# Altium footprint library 4.49-接插件.PcbLib: 260 footprints (part 5 of 17)
Each footprint in its own frame and in the unit in brackets; x right, y up, seen from the top. Pads: shape width x height; smd on the part's side, far side on the other; paste and mask are expansions set on the pad; w line width, h text height; cw(c..) or ccw(c..) is an arc to the next point about the centre after c.
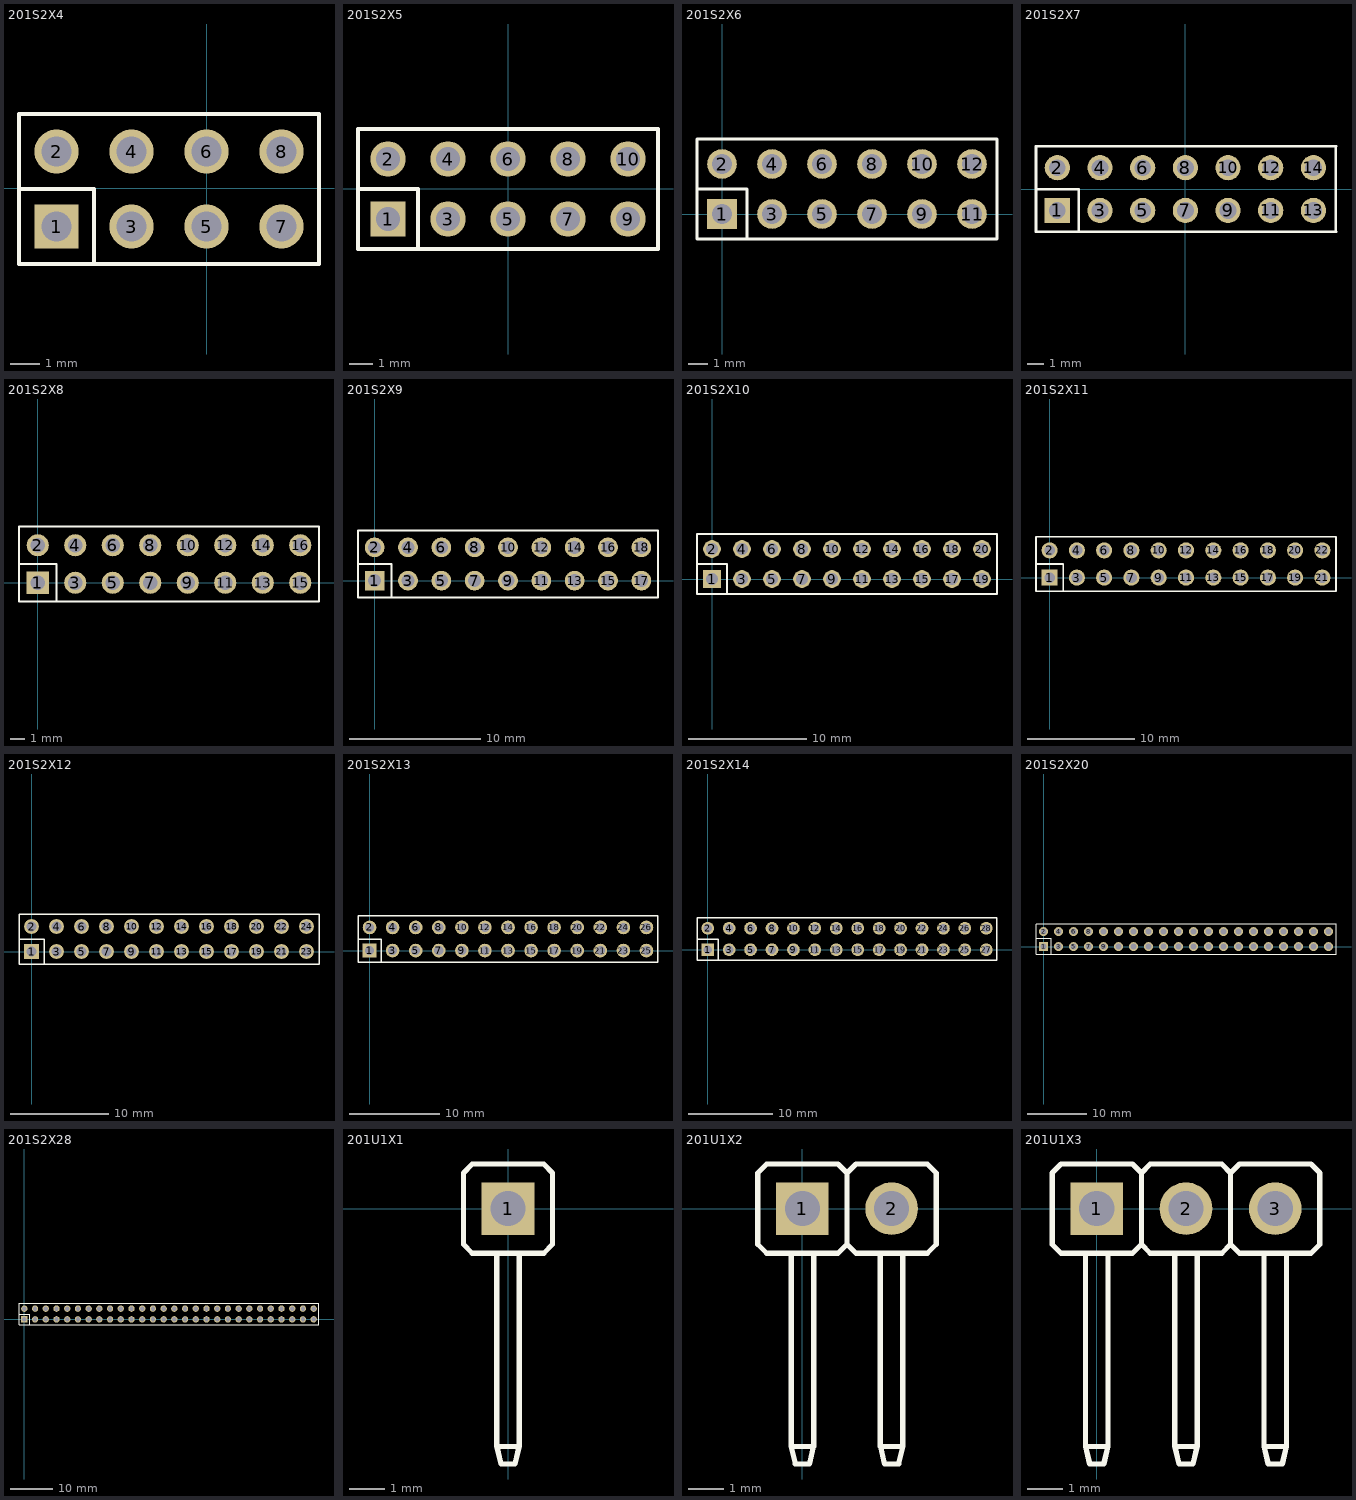
[diagram p4: the footprints below, top view; thin cyan lines are the x and y axes]

## 201S2X4 [mm]
pads (8):
  rect 1.5x1.5 hole 1: 1(-5.084,-1.29)
  round 1.5 hole 1: 2(-5.084,1.25) 3(-2.544,-1.29) 4(-2.544,1.25) 5(-0.004,-1.29) 6(-0.004,1.25) 7(2.536,-1.29) 8(2.536,1.25)
Top Overlay:
  lines w0.15: -6.354,-0.02 -3.814,-0.02 -3.814,-2.56 ; -6.354,-2.56 3.806,-2.56 3.806,2.52 -6.354,2.52 -6.354,-2.56
3D body: height 8.4, standoff -3, extent -6.354,-2.52 3.806,2.48

## 201S2X5 [mm]
pads (10):
  rect 1.5x1.5 hole 1: 1(-5.084,-1.29)
  round 1.5 hole 1: 2(-5.084,1.25) 3(-2.544,-1.29) 4(-2.544,1.25) 5(-0.004,-1.29) 6(-0.004,1.25) 7(2.536,-1.29) 8(2.536,1.25) 9(5.076,-1.29) 10(5.076,1.25)
Top Overlay:
  lines w0.15: -6.354,-0.02 -3.814,-0.02 -3.814,-2.56 ; -6.354,-2.56 -6.354,2.52 6.346,2.52 6.346,-2.56 -6.354,-2.56
3D body: height 8.4, standoff -3, extent -6.354,-2.52 6.346,2.48

## 201S2X6 [mm]
pads (12):
  rect 1.5x1.5 hole 1: 1(0,0)
  round 1.5 hole 1: 2(0,2.54) 3(2.54,0) 4(2.54,2.54) 5(5.08,0) 6(5.08,2.54) 7(7.62,0) 8(7.62,2.54) 9(10.16,0) 10(10.16,2.54) 11(12.7,0) 12(12.7,2.54)
Top Overlay:
  lines w0.15: -1.27,1.27 1.27,1.27 1.27,-1.27 ; -1.27,-1.27 13.97,-1.27 13.97,3.81 -1.27,3.81 -1.27,-1.27
3D body: height 8.4, standoff -3, extent -1.27,-1.23 13.97,3.77

## 201S2X7 [mm]
pads (14):
  rect 1.5x1.5 hole 1: 1(-7.601,-1.25)
  round 1.5 hole 1: 2(-7.601,1.29) 3(-5.061,-1.25) 4(-5.061,1.29) 5(-2.521,-1.25) 6(-2.521,1.29) 7(0.019,-1.25) 8(0.019,1.29) 9(2.559,-1.25) 10(2.559,1.29) 11(5.099,-1.25) 12(5.099,1.29) 13(7.639,-1.25) 14(7.639,1.29)
Top Overlay:
  lines w0.15: -8.871,0.02 -6.331,0.02 -6.331,-2.52 ; 8.979,-2.52 8.979,2.56 ; 8.983,-2.515 -8.871,-2.52 -8.871,2.56 8.983,2.57
3D body: height 8.4, standoff -3, extent -8.834,-2.48 8.946,2.52

## 201S2X8 [mm]
pads (16):
  rect 1.5x1.5 hole 1: 1(0,0)
  round 1.5 hole 1: 2(0,2.54) 3(2.54,0) 4(2.54,2.54) 5(5.08,0) 6(5.08,2.54) 7(7.62,0) 8(7.62,2.54) 9(10.16,0) 10(10.16,2.54) 11(12.7,0) 12(12.7,2.54) 13(15.24,0) 14(15.24,2.54) 15(17.78,0) 16(17.78,2.54)
Top Overlay:
  lines w0.15: -1.27,1.27 1.27,1.27 1.27,-1.27 ; -1.27,-1.27 -1.27,3.81 19.05,3.81 19.05,-1.27 -1.27,-1.27
3D body: height 8.4, standoff -3, extent -1.27,-1.23 19.05,3.77

## 201S2X9 [mm]
pads (18):
  rect 1.5x1.5 hole 1: 1(0,0)
  round 1.5 hole 1: 2(0,2.54) 3(2.54,0) 4(2.54,2.54) 5(5.08,0) 6(5.08,2.54) 7(7.62,0) 8(7.62,2.54) 9(10.16,0) 10(10.16,2.54) 11(12.7,0) 12(12.7,2.54) 13(15.24,0) 14(15.24,2.54) 15(17.78,0) 16(17.78,2.54) 17(20.32,0) 18(20.32,2.54)
Top Overlay:
  lines w0.15: -1.27,1.27 1.27,1.27 1.27,-1.27 ; -1.27,-1.27 -1.27,3.81 21.59,3.81 21.59,-1.27 -1.27,-1.27
3D body: height 8.4, standoff -3, extent -1.27,-1.23 21.59,3.77

## 201S2X10 [mm]
pads (20):
  rect 1.5x1.5 hole 1: 1(0,0)
  round 1.5 hole 1: 2(0,2.54) 3(2.54,0) 4(2.54,2.54) 5(5.08,0) 6(5.08,2.54) 7(7.62,0) 8(7.62,2.54) 9(10.16,0) 10(10.16,2.54) 11(12.7,0) 12(12.7,2.54) 13(15.24,0) 14(15.24,2.54) 15(17.78,0) 16(17.78,2.54) 17(20.32,0) 18(20.32,2.54) 19(22.86,0) 20(22.86,2.54)
Top Overlay:
  lines w0.15: -1.27,1.27 1.27,1.27 1.27,-1.27 ; -1.27,-1.27 -1.27,3.81 24.13,3.81 24.13,-1.27 -1.27,-1.27
3D body: height 8.4, standoff -3, extent -1.27,-1.23 24.13,3.77

## 201S2X11 [mm]
pads (22):
  rect 1.5x1.5 hole 1: 1(0,0)
  round 1.5 hole 1: 2(0,2.54) 3(2.54,0) 4(2.54,2.54) 5(5.08,0) 6(5.08,2.54) 7(7.62,0) 8(7.62,2.54) 9(10.16,0) 10(10.16,2.54) 11(12.7,0) 12(12.7,2.54) 13(15.24,0) 14(15.24,2.54) 15(17.78,0) 16(17.78,2.54) 17(20.32,0) 18(20.32,2.54) 19(22.86,0) 20(22.86,2.54) 21(25.4,0) 22(25.4,2.54)
Top Overlay:
  lines w0.15: -1.27,1.27 1.27,1.27 1.27,-1.27 ; -1.27,-1.27 26.67,-1.27 26.67,3.81 -1.27,3.81 -1.27,-1.27
3D body: height 8.4, standoff -3, extent -1.27,-1.23 26.67,3.77

## 201S2X12 [mm]
pads (24):
  rect 1.5x1.5 hole 1: 1(0,0)
  round 1.5 hole 1: 2(0,2.54) 3(2.54,0) 4(2.54,2.54) 5(5.08,0) 6(5.08,2.54) 7(7.62,0) 8(7.62,2.54) 9(10.16,0) 10(10.16,2.54) 11(12.7,0) 12(12.7,2.54) 13(15.24,0) 14(15.24,2.54) 15(17.78,0) 16(17.78,2.54) 17(20.32,0) 18(20.32,2.54) 19(22.86,0) 20(22.86,2.54) 21(25.4,0) 22(25.4,2.54) 23(27.94,0) 24(27.94,2.54)
Top Overlay:
  lines w0.15: -1.27,1.27 1.27,1.27 1.27,-1.27 ; -1.27,-1.27 29.21,-1.27 29.21,3.81 -1.27,3.81 -1.27,-1.27
3D body: height 8.89, standoff -1.27, extent -1.27,-1.27 29.21,3.81

## 201S2X13 [mm]
pads (26):
  rect 1.5x1.5 hole 1: 1(0,0)
  round 1.5 hole 1: 2(0,2.54) 3(2.54,0) 4(2.54,2.54) 5(5.08,0) 6(5.08,2.54) 7(7.62,0) 8(7.62,2.54) 9(10.16,0) 10(10.16,2.54) 11(12.7,0) 12(12.7,2.54) 13(15.24,0) 14(15.24,2.54) 15(17.78,0) 16(17.78,2.54) 17(20.32,0) 18(20.32,2.54) 19(22.86,0) 20(22.86,2.54) 21(25.4,0) 22(25.4,2.54) 23(27.94,0) 24(27.94,2.54) 25(30.48,0) 26(30.48,2.54)
Top Overlay:
  lines w0.15: -1.27,1.27 1.27,1.27 1.27,-1.27 ; -1.27,-1.27 31.75,-1.27 31.75,3.81 -1.27,3.81 -1.27,-1.27
3D body: height 8.89, standoff -1.27, extent -1.27,-1.27 31.75,3.81

## 201S2X14 [mm]
pads (28):
  rect 1.5x1.5 hole 1: 1(0,0)
  round 1.5 hole 1: 2(0,2.54) 3(2.54,0) 4(2.54,2.54) 5(5.08,0) 6(5.08,2.54) 7(7.62,0) 8(7.62,2.54) 9(10.16,0) 10(10.16,2.54) 11(12.7,0) 12(12.7,2.54) 13(15.24,0) 14(15.24,2.54) 15(17.78,0) 16(17.78,2.54) 17(20.32,0) 18(20.32,2.54) 19(22.86,0) 20(22.86,2.54) 21(25.4,0) 22(25.4,2.54) 23(27.94,0) 24(27.94,2.54) 25(30.48,0) 26(30.48,2.54) 27(33.02,0) 28(33.02,2.54)
Top Overlay:
  lines w0.15: -1.27,1.27 1.27,1.27 1.27,-1.27 ; -1.27,-1.27 34.29,-1.27 34.29,3.81 -1.27,3.81 -1.27,-1.27
3D body: height 8.89, standoff -1.27, extent -1.27,-1.27 34.29,3.81

## 201S2X20 [mm]
pads (40):
  rect 1.5x1.5 hole 1: 1(0,0)
  round 1.5 hole 1: 2(0,2.54) 3(2.54,0) 4(2.54,2.54) 5(5.08,0) 6(5.08,2.54) 7(7.62,0) 8(7.62,2.54) 9(10.16,0) 10(10.16,2.54) 11(12.7,0) 12(12.7,2.54) 13(15.24,0) 14(15.24,2.54) 15(17.78,0) 16(17.78,2.54) 17(20.32,0) 18(20.32,2.54) 19(22.86,0) 20(22.86,2.54) 21(25.4,0) 22(25.4,2.54) 23(27.94,0) 24(27.94,2.54) 25(30.48,0) 26(30.48,2.54) 27(33.02,0) 28(33.02,2.54) 29(35.56,0) 30(35.56,2.54) 31(38.1,0) 32(38.1,2.54) 33(40.64,0) 34(40.64,2.54) 35(43.18,0) 36(43.18,2.54) 37(45.72,0) 38(45.72,2.54) 39(48.26,0) 40(48.26,2.54)
Top Overlay:
  lines w0.15: -1.27,3.81 -1.27,-1.298 49.53,-1.298 49.53,3.888 -1.27,3.888 ; -1.247,1.374 -1.247,-1.321 1.295,-1.321 1.295,1.397 -1.245,1.372
3D body: height 8.89, standoff -1.27, extent -1.27,-1.284 49.53,3.796

## 201S2X28 [mm]
pads (56):
  rect 1.5x1.5 hole 1: 1(0,0)
  round 1.5 hole 1: 2(0,2.54) 3(2.54,0) 4(2.54,2.54) 5(5.08,0) 6(5.08,2.54) 7(7.62,0) 8(7.62,2.54) 9(10.16,0) 10(10.16,2.54) 11(12.7,0) 12(12.7,2.54) 13(15.24,0) 14(15.24,2.54) 15(17.78,0) 16(17.78,2.54) 17(20.32,0) 18(20.32,2.54) 19(22.86,0) 20(22.86,2.54) 21(25.4,0) 22(25.4,2.54) 23(27.94,0) 24(27.94,2.54) 25(30.48,0) 26(30.48,2.54) 27(33.02,0) 28(33.02,2.54) 29(35.56,0) 30(35.56,2.54) 31(38.1,0) 32(38.1,2.54) 33(40.64,0) 34(40.64,2.54) 35(43.18,0) 36(43.18,2.54) 37(45.72,0) 38(45.72,2.54) 39(48.26,0) 40(48.26,2.54) 41(50.8,0) 42(50.8,2.54) 43(53.34,0) 44(53.34,2.54) 45(55.88,0) 46(55.88,2.54) 47(58.42,0) 48(58.42,2.54) 49(60.96,0) 50(60.96,2.54) 51(63.5,0) 52(63.5,2.54) 53(66.04,0) 54(66.04,2.54) 55(68.58,0) 56(68.58,2.54)
Top Overlay:
  lines w0.15: -1.27,1.27 1.27,1.27 1.27,-1.27 ; -1.27,-1.27 -1.27,3.81 69.85,3.81 69.85,-1.27 -1.27,-1.27
3D body: height 8.89, standoff -1.27, extent -1.27,-1.27 69.85,3.81

## 201U1X1 [mm]
pads (1):
  rect 1.5x1.5 hole 1: 1(0,0)
Top Overlay:
  lines w0.15: -0.32,-1.28 -0.32,-6.77 ; 0.32,-1.28 0.32,-6.77 ; -0.32,-6.77 -0.2,-7.27 0.2,-7.27 0.32,-6.77 ; -0.32,-6.77 0.32,-6.77 ; -1.27,-1.016 -1.27,1.016 -1.016,1.27 1.016,1.27 1.27,1.016 1.27,-1.016 1.016,-1.27 -1.016,-1.27 -1.27,-1.016
3D body: height 5.12, standoff -3, extent -1.27,-7.27 1.27,1.27

## 201U1X2 [mm]
pads (2):
  rect 1.5x1.5 hole 1: 1(0,0)
  round 1.5 hole 1: 2(2.54,0)
Top Overlay:
  lines w0.15: -0.32,-1.28 -0.32,-6.77 ; 0.32,-1.28 0.32,-6.77 ; 2.22,-1.28 2.22,-6.77 ; 2.86,-1.28 2.86,-6.77 ; -0.32,-6.77 0.32,-6.77 ; -0.32,-6.77 -0.2,-7.27 0.2,-7.27 0.32,-6.77 ; 1.27,-1.016 1.016,-1.27 -1.016,-1.27 -1.27,-1.016 -1.27,1.016 -1.016,1.27 1.016,1.27 1.27,1.016 ; 1.27,-1.016 1.27,1.016 ; 1.27,-1.016 1.524,-1.27 3.556,-1.27 3.81,-1.016 3.81,1.016 3.556,1.27 1.524,1.27 1.27,1.016 ; 2.22,-6.77 2.34,-7.27 2.74,-7.27 2.86,-6.77 ; 2.22,-6.77 2.86,-6.77
3D body: height 5.12, standoff -3, extent -1.27,-7.27 3.81,1.27

## 201U1X3 [mm]
pads (3):
  rect 1.5x1.5 hole 1: 1(0,0)
  round 1.5 hole 1: 2(2.54,0) 3(5.08,0)
Top Overlay:
  lines w0.15: -0.32,-1.28 -0.32,-6.77 ; 0.32,-1.28 0.32,-6.77 ; 2.22,-1.28 2.22,-6.77 ; 2.86,-1.28 2.86,-6.77 ; 4.76,-1.28 4.76,-6.77 ; 5.4,-1.28 5.4,-6.77 ; -0.32,-6.77 -0.2,-7.27 0.2,-7.27 0.32,-6.77 ; -0.32,-6.77 0.32,-6.77 ; 1.27,-1.016 1.524,-1.27 3.556,-1.27 3.81,-1.016 ; 1.27,-1.016 1.27,1.016 ; 1.27,-1.016 1.016,-1.27 -1.016,-1.27 -1.27,-1.016 -1.27,1.016 -1.016,1.27 1.016,1.27 1.27,1.016 ; 1.27,1.016 1.524,1.27 3.556,1.27 3.81,1.016 ; 2.22,-6.77 2.86,-6.77 ; 2.22,-6.77 2.34,-7.27 2.74,-7.27 2.86,-6.77 ; 3.81,-1.016 3.81,1.016 ; 3.81,-1.016 4.064,-1.27 6.096,-1.27 6.35,-1.016 6.35,1.016 6.096,1.27 4.064,1.27 3.81,1.016 ; 4.76,-6.77 4.88,-7.27 5.28,-7.27 5.4,-6.77 ; 4.76,-6.77 5.4,-6.77
3D body: height 5.12, standoff -3, extent -1.27,-7.27 6.35,1.27